# Altium footprint library connector.PcbLib: 172 footprints (part 3 of 11)
Each footprint in its own frame and in the unit in brackets; x right, y up, seen from the top. Pads: shape width x height; smd on the part's side, far side on the other; paste and mask are expansions set on the pad; w line width, h text height; cw(c..) or ccw(c..) is an arc to the next point about the centre after c.
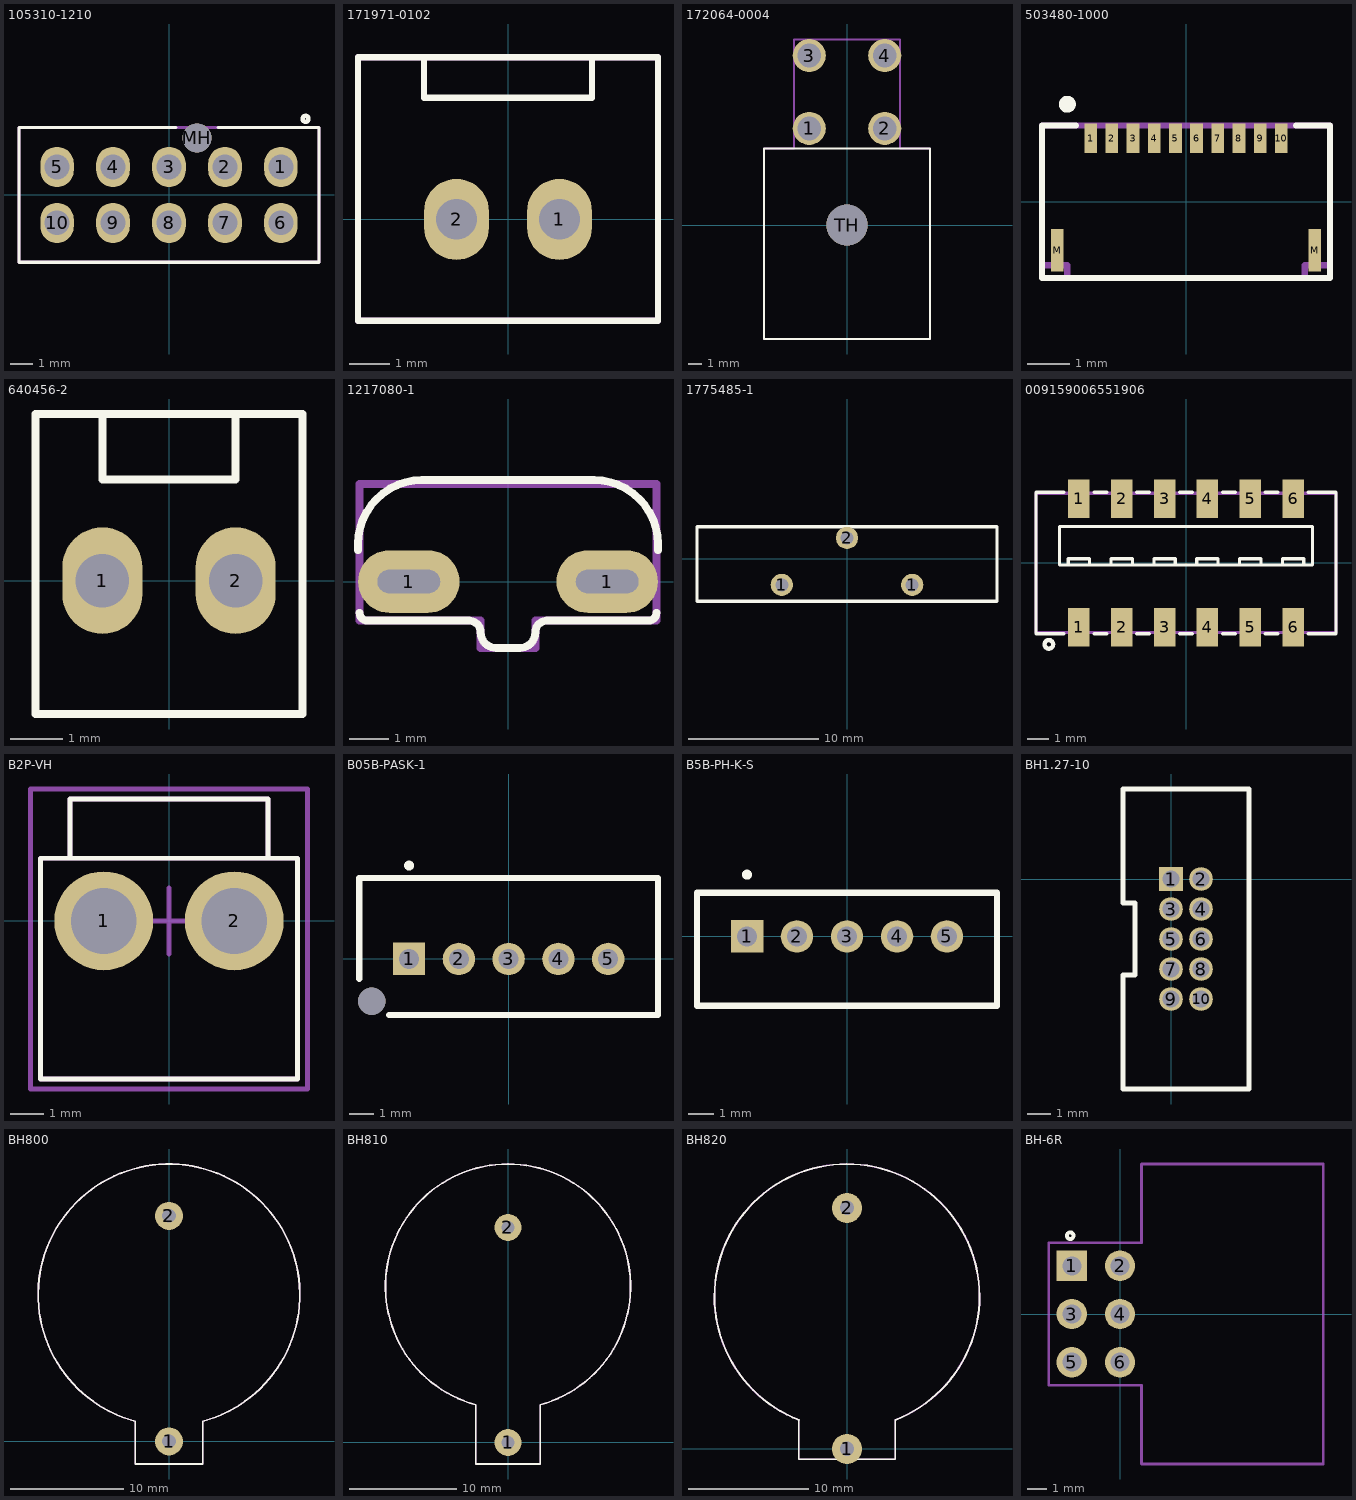
[diagram p2: the footprints below, top view; thin cyan lines are the x and y axes]

## 105310-1210 [mm]
pads (11):
  oval 1.5x1.8 hole 1.1: 1(5,1.25) 2(2.5,1.25) 3(0,1.25) 4(-2.5,1.25) 5(-5,1.25) 6(5,-1.25) 7(2.5,-1.25) 8(0,-1.25) 9(-2.5,-1.25) 10(-5,-1.25)
  round 1.3 hole 1.3 unplated: MH(1.25,2.55)
Top Overlay:
  circle w0.2: c6.1,3.4 r0.13
  lines w0.15: 0.3,3.01 -6.7,3.01 -6.7,-3 6.7,-3 6.7,3.01 2.2,3.01
Top Courtyard:
  lines w0.15: -6.7,-3 0,-3 6.7,-3 6.7,3.01 -6.7,3.01 -6.7,-3
3D body "1053101110.stp": height 10.68, standoff -3.03, extent -6.72,-2.99 6.72,5.85

## 171971-0102 [mm]
height 12
pads (2):
  oval 1.6x2 hole 1: 1(1.27,0) 2(-1.27,0)
Top Overlay:
  lines w0.15: -1.011,4 -2.07,4 -2.07,3 0,3 2.07,3 2.07,4 ; -3.7,-2.5 -3.7,4 3.7,4 3.7,-2.5 -3.7,-2.5
Top Courtyard:
  lines w0.15: -3.7,-2.5 3.7,-2.5 3.7,4 -3.7,4 -3.7,-2.5
3D body "1719710002.stp": height 11.8, standoff -3.31, extent -3.69,-2.55 3.69,4.05

## 172064-0004 [mm] "172064-0004 & 76825-0004"
height 15
pads (5):
  round 2.5 hole 1.8: 1(-2.85,7.3) 2(2.85,7.3) 3(-2.85,12.8) 4(2.85,12.8)
  round 3.1 hole 3.1 unplated: TH(0,0)
Top Overlay:
  lines w0.15: -6.25,-8.6 -6.25,5.775 -0.575,5.775 6.25,5.775 6.25,-8.6 -6.25,-8.6
Top Courtyard:
  lines w0.15: -6.25,-8.6 -6.25,5.775 -4,5.775 -4,14 4,14 4,5.775 6.25,5.775 6.25,-8.6 -6.25,-8.6
3D body "172064-0004.stp": height 14.62, standoff -3.52, extent -6.03,-8.587 6.03,13.375

## 503480-1000 [mm]
height 1
pads (12):
  rect 0.3x0.7 smd: 1(-2.25,1.5) 2(-1.75,1.5) 3(-1.25,1.5) 4(-0.75,1.5) 5(-0.25,1.5) 6(0.25,1.5) 7(0.75,1.5) 8(1.25,1.5) 9(1.75,1.5) 10(2.25,1.5)
  rect 0.3x1 smd: M(-3.04,-1.15) M(3.04,-1.15)
Top Overlay:
  circle w0.2: c-2.8,2.3 r0.1
  lines w0.15: -2.6,1.8 -3.4,1.8 -3.4,-1.801 0,-1.801 3.4,-1.801 3.4,1.8 2.6,1.8
Top Courtyard:
  lines w0.15: -3.4,-1.5 -2.8,-1.5 -2.8,-1.8 2.8,-1.8 2.8,-1.5 3.4,-1.5 3.4,1.8 -3.4,1.8 -3.4,-1.5
3D body "5034801000.stp": height 1.88, standoff -0.02, extent -3.35,-1.82 3.35,1.78

## 640456-2 [mil]
pads (2):
  oval 60x80 hole 40: 1(-50,0) 2(50,0)
Top Overlay:
  lines w5.91: -50,125 -50,75.97 50,75.97 50,125 ; -100,-100 100,-100 100,125 -100,125 -100,-100
3D body "User Library-640456-2.step": height 395, standoff -140, extent -100,-104.99 100,125

## 1217080-1 [mm]
pads (2):
  oval 2.6x1.6 hole 0.6 slot 1.6 at 0 deg: 1(-2.54,0) 1(2.54,0)
Top Overlay:
  lines w0.2: -3.84,0.8 -3.84,0.96 cw(c-2.2,0.96) -2.2,2.6 0.1,2.6 ; -3.8,-0.8 ccw(c-3.6,-0.8) -3.6,-1 -1.24,-1 -1,-1 cw(c-1,-1.3) -0.7,-1.3 ccw(c-0.3,-1.3) -0.3,-1.7 0,-1.7 0.3,-1.7 ccw(c0.3,-1.3) 0.7,-1.3 cw(c1,-1.3) 1,-1 1.24,-1 3.6,-1 ccw(c3.6,-0.8) 3.8,-0.8 ; -0.1,2.6 2.2,2.6 cw(c2.2,0.96) 3.84,0.96 3.84,0.8
Top Courtyard:
  lines w0.2: -3.8,-1 -0.7,-1 -0.7,-1.7 0,-1.7 0.7,-1.7 0.7,-1 3.8,-1 3.8,2.5 0,2.5 -3.8,2.5 -3.8,-1
3D body "1217080-1.stp": height 9.91, standoff -3.81, extent -3.699,-1.675 3.794,2.567

## 1775485-1 [mm]
height 18.5
pads (3):
  round 1.7 hole 1: 1(-5,-2) 1(5,-2) 2(0,1.6)
Top Overlay:
  lines w0.254: -11.5,-3.25 -11.5,0 -11.5,2.45 0.55,2.45 11.5,2.45 11.5,0 11.5,-3.25 -0.25,-3.25 -11.5,-3.25
3D body "User Library-TE_2-1775485-1_CR2032_bat_vert_holder.step": height 18.5, standoff -4, extent -11.5,-3.35 11.5,2.45

## 009159006551906 [mm]
height 5
pads (12):
  rect 1x1.8 smd: 1(-5,-3) 1(-5,3) 2(-3,-3) 2(-3,3) 3(-1,-3) 3(-1,3) 4(1,-3) 4(1,3) 5(3,-3) 5(3,3) 6(5,-3) 6(5,3)
Top Overlay:
  circle w0.2: c-6.4,-3.8 r0.2
  lines w0.15: -5.7,-3.3 -7,-3.3 -7,0.1 -7,3.3 -5.7,3.3 ; -5.487,-0.1 -5.5,-0.1 -5.5,0.2 -4.5,0.2 -4.5,-0.1 ; -4.3,-3.3 -3.7,-3.3 ; -4.3,3.3 -3.7,3.3 ; -3.5,-0.1 -3.5,0.2 -2.5,0.2 -2.5,-0.1 ; -2.3,-3.3 -1.7,-3.3 ; -2.3,3.3 -1.7,3.3 ; -1.5,-0.1 -1.5,0.2 -0.5,0.2 -0.5,-0.1 ; -0.3,-3.3 0.3,-3.3 ; -0.3,3.3 0.3,3.3 ; 0.5,-0.1 0.5,0.2 1.5,0.2 1.5,-0.1 ; 1.7,-3.3 2.3,-3.3 ; 1.7,3.3 2.3,3.3 ; 2.5,-0.1 2.5,0.2 3.5,0.2 3.5,-0.1 ; 3.7,-3.3 4.3,-3.3 ; 3.7,3.3 4.3,3.3 ; 4.5,-0.1 4.5,0.2 5.5,0.2 5.5,-0.1 ; 5.7,-3.3 7,-3.3 7,0.1 7,3.3 5.7,3.3 ; -5.9,-0.1 -5.9,1.7 0,1.7 5.9,1.7 5.9,-0.1 -0.2,-0.1 -5.9,-0.1
Top Courtyard:
  lines w0.15: -7,-3.25 -7,3.25 7,3.25 7,-3.25 -7,-3.25
3D body "AVX-00-9159-006-551-906.STEP": height 5.1, standoff 0.05, extent -7,-3.75 7,3.75

## B2P-VH [mm]
height 11
pads (2):
  round 3 hole 2: 1(-1.98,0) 2(1.98,0)
Top Overlay:
  lines w0.15: -3,1.9 -3,3.7 3,3.7 3,1.9 ; -3.9,1.9 3.9,1.9 ; -3.9,1.9 -3.9,-4.8 3.9,-4.8 3.9,1.9 ; -3.9,1.9 3.9,1.9
Mechanical 15:
  lines w0.15: -1,0 1,0 ; 0,-1 0,1 ; -4.2,-5.1 4.2,-5.1 4.2,4 -4.2,4 -4.2,-5.1
Mechanical 29:
  lines w0.15: -3,1.9 -3,3.7 3,3.7 3,1.9 ; -3.9,1.9 3.9,1.9 ; -3.9,1.9 -3.9,-4.8 3.9,-4.8 3.9,1.9 ; -3.9,1.9 3.9,1.9
  text ".Designator" at -3,-1.8 h1
3D body "B2P-VH-BK.STEP": height 10.9, standoff -3.7, extent -3.93,-4.65 3.93,3.85

## B05B-PASK-1 [mm]
pads (6):
  rect 1.3x1.3 hole 0.8: 1(-4,0)
  round 1.3 hole 0.8: 2(-2,0) 3(0,0) 4(2,0) 5(4,0)
  round 1.1 hole 1.1 unplated: ""(-5.5,-1.7)
Top Overlay:
  circle w0.2: c-4,3.75 r0.1
  lines w0.254: -6,-0.8 -6,3.25 6,3.25 6,-2.25 -4.8,-2.25
3D body "B05B-PASK-1.STEP": height 7.85, standoff -2.85, extent -6,-2.2 6,3.1

## B5B-PH-K-S [mm]
pads (5):
  rect 1.3x1.3 hole 0.8: 1(-4,0)
  round 1.3 hole 0.8: 2(-2,0) 3(0,0) 4(2,0) 5(4,0)
Top Overlay:
  circle w0.2: c-4,2.475 r0.1
  lines w0.254: -6,-2.775 -6,1.75 6,1.75 6,-2.775 -6,-2.775
3D body "B5B-PH-K-S.STEP": height 6, standoff -3.4, extent -5.95,-2.75 5.95,1.75

## BH1.27-10 [mm] "BH1.27-10"
pads (10):
  rect 1x1 hole 0.7: 1(0,0)
  round 1 hole 0.7: 2(1.27,0) 3(0,-1.27) 4(1.27,-1.27) 5(0,-2.54) 6(1.27,-2.54) 7(0,-3.81) 8(1.27,-3.81) 9(0,-5.08) 10(1.27,-5.08)
Top Overlay:
  lines w0.2: -2.032,-8.89 -2.032,-4.064 -1.524,-4.064 -1.524,-1.016 -2.032,-1.016 -2.032,3.81 3.302,3.81 3.302,-8.89 -2.032,-8.89
3D body "CONB127P-2R-10W_TH.STEP": height 5.4, standoff -2.1, extent -2.015,-8.865 3.185,3.785

## BH800 [mm]
height 6.6
pads (2):
  round 2.5 hole 1.2: 1(0,0) 2(0,20)
Top Overlay:
  lines w0.15: -3.001,1.795 cw(c0,13) 3.001,1.795 ; -3,1.8 -3,-2 3,-2 3,1.8
Top Courtyard:
  lines w0.15: -3.001,1.795 cw(c0,13) 3.001,1.795 ; -3,1.8 -3,-2 3,-2 3,1.8
3D body: height 8.2, standoff 0, extent -11.6,1.403 11.6,24.597
3D body: height 8.2, standoff 0, extent -3,-2 3,3.5

## BH810 [mm]
height 6.6
pads (2):
  round 2.5 hole 1.2: 1(0,0) 2(0,20)
Top Overlay:
  lines w0.15: -3,3.5 -3,-2 3,-2 3,3.5 ; -3,3.502 cw(c0,14.5) 3,3.502
Top Courtyard:
  lines w0.15: -3,3.5 -3,-2 3,-2 3,3.5 ; -3,3.502 cw(c0,14.5) 3,3.502
3D body: height 6.6, standoff 0, extent -11.4,3.103 11.4,25.897
3D body: height 6.6, standoff 0, extent -3,-2 3,3.5

## BH820 [mm]
height 6.6
pads (2):
  round 2.5 hole 1.2: 1(0,0) 2(0,20)
Top Overlay:
  lines w0.15: -4,2.35 -4,-0.85 4,-0.85 4,2.35 ; -3.982,2.396 cw(c0,12.65) 4.016,2.409
Top Courtyard:
  lines w0.15: -4,2.396 -4,-0.85 4,-0.85 4,2.396 ; -3.998,2.402 cw(c0,12.65) 3.998,2.402
3D body: height 8.5, standoff 0, extent -11.4,0.753 11.4,23.547
3D body: height 8.5, standoff 0, extent -4,-0.847 4,2.353

## BH-6R [mm] "BH-6R(IDC-6R)"
height 7
pads (6):
  rect 1.6x1.6 hole 1: 1(-2.54,2.54)
  round 1.6 hole 1: 2(0,2.54) 3(-2.54,0) 4(0,0) 5(-2.54,-2.54) 6(0,-2.54)
Top Overlay:
  circle w0.2: c-2.625,4.125 r0.175
Top Courtyard:
  lines w0.15: -3.75,-3.75 -3.75,0 -3.75,3.75 1.125,3.75 1.125,7.9 10.7,7.9 10.7,0 10.7,-7.9 1.125,-7.9 1.125,-3.75 -3.75,-3.75
3D body "User Library-IDC Socket Male 6pin Angled THT Goldplated 2_54mm.step": height 8.85, standoff -2.5, extent -2.86,-7.93 10.7,7.93